# Altium footprint library HeadersPin_1rows_M_180.PcbLib: 40 footprints (part 1 of 3)
Each footprint in its own frame and in the unit in brackets; x right, y up, seen from the top. Pads: shape width x height; smd on the part's side, far side on the other; paste and mask are expansions set on the pad; w line width, h text height; cw(c..) or ccw(c..) is an arc to the next point about the centre after c.
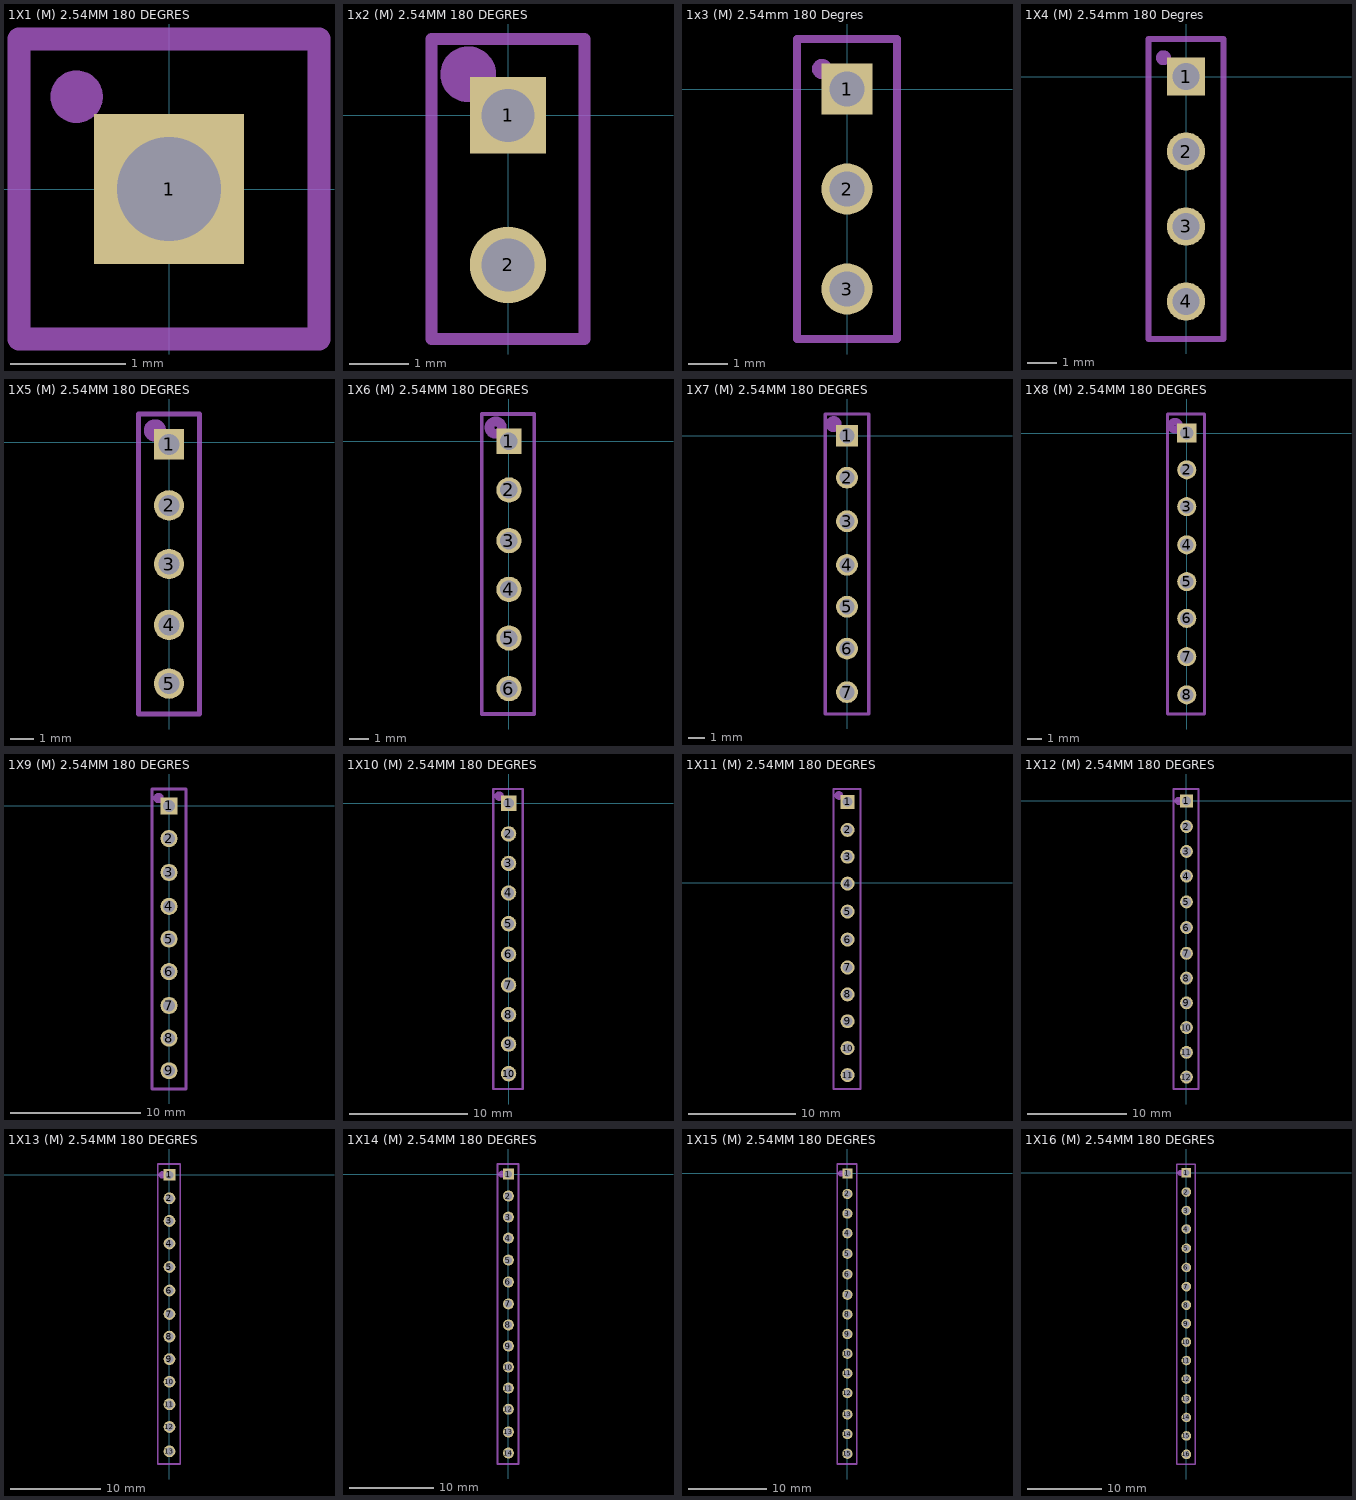
[diagram p0: the footprints below, top view; thin cyan lines are the x and y axes]

## 1X1 (M) 2.54MM 180 DEGRES [mm]
pads (1):
  rect 1.3x1.3 hole 0.9 mask+0.05: 1(0,0)
Mechanical 2:
  circle w0.254: c-0.8,0.8 r0.1
  lines w0.2: -1.3,-1.3 1.3,-1.3 1.3,1.3 -1.3,1.3 -1.3,-1.3
  text ".Designator" at 0.381,-0.635 h1.52
3D body "1x1 Male Pin Header.STEP": height 10.54, standoff -3, extent -1.25,-1.27 1.25,1.275

## 1x2 (M) 2.54MM 180 DEGRES [mm]
pads (2):
  rect 1.3x1.3 hole 0.9 mask+0.05: 1(0,0)
  round 1.3 hole 0.9 mask+0.05: 2(0,-2.54)
Mechanical 2:
  circle w0.5: c-0.676,0.7 r0.224
  lines w0.2: -1.3,-3.8 -1.3,1.3 1.3,1.3 1.3,-3.8 -1.3,-3.8
  text ".Designator" at 0.713,-3.546 h1
3D body "1x2 Male Pin Header.STEP": height 10.54, standoff -3, extent -1.23,-3.81 1.27,1.275

## 1x3 (M) 2.54mm 180 Degres [mm]
pads (3):
  rect 1.3x1.3 hole 0.9 mask+0.05: 1(0,0)
  round 1.3 hole 0.9 mask+0.05: 2(0,-2.54) 3(0,-5.08)
Mechanical 2:
  circle w0.254: c-0.635,0.508 r0.127
  lines w0.2: -1.27,-6.35 1.27,-6.35 1.27,1.27 -1.27,1.27 -1.27,-6.35
  text ".Designator" at 0.683,-5.334 h1
3D body "1x3 Male Pin Header.STEP": height 10.54, standoff -3, extent -1.27,-6.353 1.23,1.273

## 1X4 (M) 2.54mm 180 Degres [mm]
pads (4):
  rect 1.3x1.3 hole 0.9 mask+0.05: 1(0,0)
  round 1.3 hole 0.9 mask+0.05: 2(0,-2.54) 3(0,-5.08) 4(0,-7.62)
Mechanical 2:
  circle w0.254: c-0.762,0.635 r0.127
  lines w0.2: -1.27,-8.89 -1.27,1.27 1.27,1.27 1.27,-8.89 -1.27,-8.89
  text ".Designator" at 0.762,-6.477 h1.52
3D body "1x4 Male Pin Header.STEP": height 10.54, standoff -3, extent -1.23,-8.893 1.27,1.273

## 1X5 (M) 2.54MM 180 DEGRES [mm]
pads (5):
  rect 1.3x1.3 hole 0.9 mask+0.05: 1(0,-0.1)
  round 1.3 hole 0.9 mask+0.05: 2(0,-2.7) 3(0,-5.2) 4(0,-7.8) 5(0,-10.3)
Mechanical 2:
  circle w0.5: c-0.6,0.5 r0.224
  lines w0.2: -1.3,-11.6 -1.3,1.2 1.3,1.2 1.3,-11.6 -1.3,-11.6
  text ".Designator" at 0.838,-11.246 h1.52
3D body "1x5 Male Pin Header.STEP": height 10.54, standoff -3, extent -1.3,-11.553 1.2,1.153

## 1X6 (M) 2.54MM 180 DEGRES [mm]
pads (6):
  rect 1.3x1.3 hole 0.9 mask+0.05: 1(0,0)
  round 1.3 hole 0.9 mask+0.05: 2(0,-2.5) 3(0,-5.1) 4(0,-7.6) 5(0,-10.1) 6(0,-12.7)
Mechanical 2:
  circle w0.5: c-0.684,0.7 r0.316
  lines w0.2: -1.4,-14 1.3,-14 1.3,1.4 -1.4,1.4 -1.4,-14
  text ".Designator" at 0.438,-13.446 h1.52
3D body "1x6 Male Pin Header.STEP": height 10.54, standoff -3, extent -1.3,-13.923 1.2,1.323

## 1X7 (M) 2.54MM 180 DEGRES [mm]
pads (7):
  rect 1.3x1.3 hole 0.9 mask+0.05: 1(0,0)
  round 1.3 hole 0.9 mask+0.05: 2(0,-2.5) 3(0,-5.1) 4(0,-7.7) 5(0,-10.2) 6(0,-12.7) 7(0,-15.3)
Mechanical 2:
  circle w0.5: c-0.8,0.7 r0.224
  lines w0.2: -1.3,-16.6 1.3,-16.6 1.3,1.3 -1.3,1.3 -1.3,-16.6
  text ".Designator" at 0.538,-12.946 h1.52
3D body "1x7 Male Pin Header.STEP": height 10.54, standoff -3, extent -1.2,-16.543 1.3,1.243

## 1X8 (M) 2.54MM 180 DEGRES [mm]
pads (8):
  rect 1.3x1.3 hole 0.9 mask+0.05: 1(0,0)
  round 1.3 hole 0.9 mask+0.05: 2(0,-2.5) 3(0,-5) 4(0,-7.6) 5(0,-10.1) 6(0,-12.6) 7(0,-15.2) 8(0,-17.8)
Mechanical 2:
  circle w0.5: c-0.8,0.5 r0.283
  lines w0.2: -1.3,-19.1 -1.3,1.3 1.2,1.3 1.2,-19.1 -1.3,-19.1
  text ".Designator" at 0.838,-11.946 h1.52
3D body "1x8 Male Pin Header.STEP": height 10.54, standoff -3, extent -1.3,-19.025 1.2,1.3

## 1X9 (M) 2.54MM 180 DEGRES [mm]
pads (9):
  rect 1.3x1.3 hole 0.9 mask+0.05: 1(0,0)
  round 1.3 hole 0.9 mask+0.05: 2(0,-2.5) 3(0,-5.1) 4(0,-7.7) 5(0,-10.2) 6(0,-12.7) 7(0,-15.3) 8(0,-17.8) 9(0,-20.3)
Mechanical 2:
  circle w0.5: c-0.8,0.6 r0.141
  lines w0.2: -1.3,-21.7 -1.3,1.3 1.3,1.3 1.3,-21.7 -1.3,-21.7
  text ".Designator" at 0.638,-9.046 h1.52
3D body "1x9 Male Pin Header.STEP": height 3, standoff -10.54, extent -1.25,-21.595 1.25,1.27

## 1X10 (M) 2.54MM 180 DEGRES [mm]
pads (10):
  rect 1.3x1.3 hole 0.9 mask+0.05: 1(0,0)
  round 1.3 hole 0.9 mask+0.05: 2(0,-2.6) 3(0,-5.1) 4(0,-7.6) 5(0,-10.2) 6(0,-12.8) 7(0,-15.4) 8(0,-17.9) 9(0,-20.4) 10(0,-22.9)
Mechanical 2:
  circle w0.4: c-0.8,0.6 r0.2
  lines w0.2: -1.3,-24.2 -1.3,1.2 1.2,1.2 1.2,-24.2 -1.3,-24.2
  text ".Designator" at 0.538,-11.946 h1.52
3D body "1x10 Male Pin Header.STEP": height 10.54, standoff -3, extent -1.3,-24.205 1.2,1.2

## 1X11 (M) 2.54MM 180 DEGRES [mm]
pads (11):
  rect 1.3x1.3 hole 0.9 mask+0.05: 1(20.5,7.5)
  round 1.3 hole 0.9 mask+0.05: 2(20.5,4.9) 3(20.5,2.4) 4(20.5,-0.1) 5(20.5,-2.7) 6(20.5,-5.3) 7(20.5,-7.9) 8(20.5,-10.4) 9(20.5,-12.9) 10(20.5,-15.4) 11(20.5,-17.9)
Mechanical 2:
  circle w0.4: c19.7,8.1 r0.2
  lines w0.2: 19.2,-19.2 19.2,8.7 21.7,8.7 21.7,-19.2 19.2,-19.2
  text ".Designator" at 21.038,-4.446 h1.52
3D body "1x11 Male Pin Header.STEP": height 10.54, standoff -3, extent 19.25,-19.17 21.75,8.775

## 1X12 (M) 2.54MM 180 DEGRES [mm]
pads (12):
  rect 1.3x1.3 hole 0.9 mask+0.05: 1(0,0)
  round 1.3 hole 0.9 mask+0.05: 2(0,-2.6) 3(0,-5.1) 4(0,-7.6) 5(0,-10.2) 6(0,-12.8) 7(0,-15.4) 8(0,-17.9) 9(0,-20.4) 10(0,-22.9) 11(0,-25.4) 12(0,-27.9)
Mechanical 2:
  circle w0.4: c-0.8,0 r0.2
  lines w0.2: -1.3,-29.1 1.2,-29.1 1.2,1.2 -1.3,1.2 -1.3,-29.1
  text ".Designator" at 0.538,-11.946 h1.52
3D body "1x12 Male Pin Header.STEP": height 10.54, standoff -3, extent -1.3,-29.1 1.2,1.385

## 1X13 (M) 2.54MM 180 DEGRES [mm]
pads (13):
  rect 1.3x1.3 hole 0.9 mask+0.05: 1(0,0)
  round 1.3 hole 0.9 mask+0.05: 2(0,-2.6) 3(0,-5.1) 4(0,-7.6) 5(0,-10.2) 6(0,-12.8) 7(0,-15.4) 8(0,-17.9) 9(0,-20.4) 10(0,-22.9) 11(0,-25.4) 12(0,-27.9) 13(0,-30.6)
Mechanical 2:
  circle w0.4: c-0.8,0 r0.2
  lines w0.2: -1.3,-32 1.2,-32 1.2,1.2 -1.3,1.2 -1.3,-32
  text ".Designator" at 0.538,-11.946 h1.52
3D body "1x13 Male Pin Header.STEP": height 10.54, standoff -3, extent -1.3,-31.8 1.2,1.225

## 1X14 (M) 2.54MM 180 DEGRES [mm]
pads (14):
  rect 1.3x1.3 hole 0.9 mask+0.05: 1(0,0)
  round 1.3 hole 0.9 mask+0.05: 2(0,-2.6) 3(0,-5.1) 4(0,-7.6) 5(0,-10.2) 6(0,-12.8) 7(0,-15.4) 8(0,-17.9) 9(0,-20.4) 10(0,-22.9) 11(0,-25.4) 12(0,-27.9) 13(0,-30.6) 14(0,-33.1)
Mechanical 2:
  circle w0.4: c-0.8,0 r0.2
  lines w0.2: -1.3,-34.4 1.2,-34.4 1.2,1.2 -1.3,1.2 -1.3,-34.4
  text ".Designator" at 0.538,-11.946 h1.52
3D body "1x14 Male Pin Header.STEP": height 10.54, standoff -3, extent -1.3,-34.365 1.2,1.2

## 1X15 (M) 2.54MM 180 DEGRES [mm]
pads (15):
  rect 1.3x1.3 hole 0.9 mask+0.05: 1(0,0)
  round 1.3 hole 0.9 mask+0.05: 2(0,-2.6) 3(0,-5.1) 4(0,-7.6) 5(0,-10.2) 6(0,-12.8) 7(0,-15.4) 8(0,-17.9) 9(0,-20.4) 10(0,-22.9) 11(0,-25.4) 12(0,-27.9) 13(0,-30.6) 14(0,-33.1) 15(0,-35.6)
Mechanical 2:
  circle w0.4: c-0.8,0 r0.2
  lines w0.2: -1.3,-36.9 1.2,-36.9 1.2,1.2 -1.3,1.2 -1.3,-36.9
  text ".Designator" at 0.538,-11.946 h1.52
3D body "1x15 Male Pin Header.STEP": height 10.54, standoff -3, extent -1.25,-36.87 1.25,1.235

## 1X16 (M) 2.54MM 180 DEGRES [mm]
pads (16):
  rect 1.3x1.3 hole 0.9 mask+0.05: 1(0,0)
  round 1.3 hole 0.9 mask+0.05: 2(0,-2.6) 3(0,-5.1) 4(0,-7.6) 5(0,-10.2) 6(0,-12.8) 7(0,-15.4) 8(0,-17.9) 9(0,-20.4) 10(0,-22.9) 11(0,-25.4) 12(0,-27.9) 13(0,-30.6) 14(0,-33.1) 15(0,-35.6) 16(0,-38.1)
Mechanical 2:
  circle w0.4: c-0.8,0 r0.2
  lines w0.2: -1.3,-39.4 -1.3,1.2 1.2,1.2 1.2,-39.4 -1.3,-39.4
  text ".Designator" at 0.838,-11.446 h1.52
3D body "1x16 Male Pin Header.STEP": height 10.54, standoff -3, extent -1.3,-39.4 1.2,1.245